# Altium footprint library PcbLib_ICs.PcbLib: 317 footprints (part 1 of 24)
Each footprint in its own frame and in the unit in brackets; x right, y up, seen from the top. Pads: shape width x height; smd on the part's side, far side on the other; paste and mask are expansions set on the pad; w line width, h text height; cw(c..) or ccw(c..) is an arc to the next point about the centre after c.
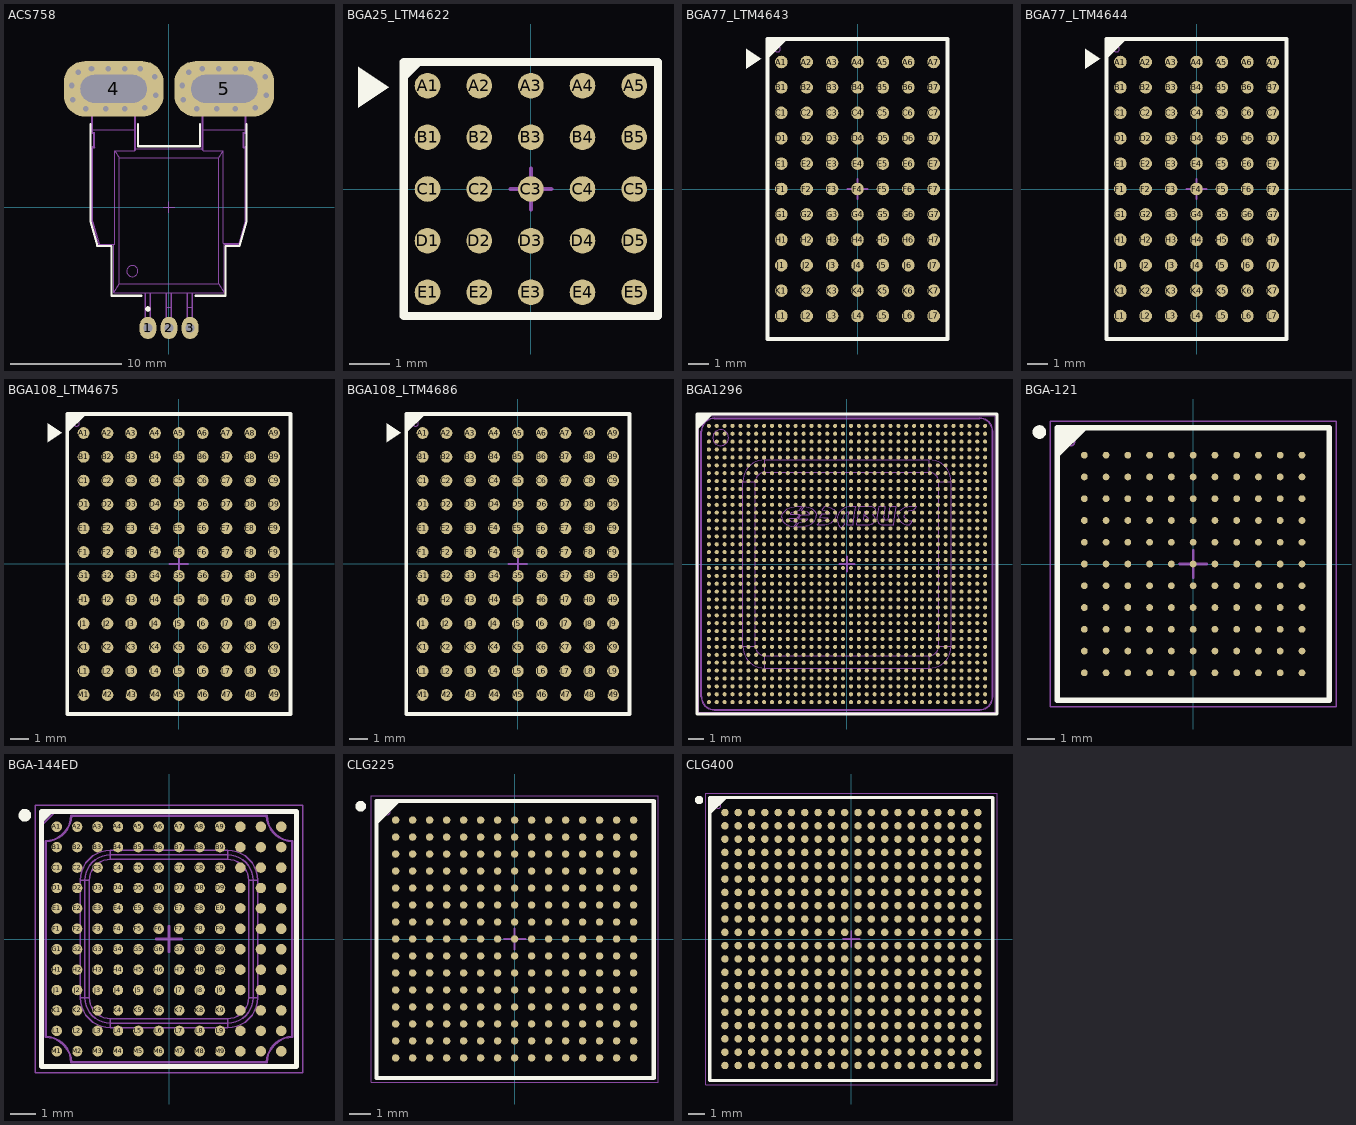
[diagram p0: the footprints below, top view; thin cyan lines are the x and y axes]

## ACS758 [mm]
pads (5):
  oval 1.5x2 hole 0.8: 1(-1.9,-10.911) 2(0,-10.911) 3(1.9,-10.911)
  rrect75% 9x5 hole 2.5 slot 6 at 0 deg mask+0.102: 4(-5,10.689) 5(5,10.689)
via 3,12.489 diameter 1.27 hole 0.5
via 4.5,12.489 diameter 1.27 hole 0.5
via 6,12.489 diameter 1.27 hole 0.5
via 7.4,12.489 diameter 1.27 hole 0.5
via 8.7,11.789 diameter 1.27 hole 0.5
via 8.8,10.089 diameter 1.27 hole 0.5
via 7.8,8.989 diameter 1.27 hole 0.5
via 6,8.889 diameter 1.27 hole 0.5
via 4.3,8.889 diameter 1.27 hole 0.5
via 2.5,8.889 diameter 1.27 hole 0.5
via 1.3,9.689 diameter 1.27 hole 0.5
via 1.8,12.189 diameter 1.27 hole 0.5
via 1.2,10.989 diameter 1.27 hole 0.5
via -8.8,10.989 diameter 1.27 hole 0.5
via -8.2,12.189 diameter 1.27 hole 0.5
via -8.7,9.689 diameter 1.27 hole 0.5
via -7.5,8.889 diameter 1.27 hole 0.5
via -5.7,8.889 diameter 1.27 hole 0.5
via -4,8.889 diameter 1.27 hole 0.5
via -2.2,8.989 diameter 1.27 hole 0.5
via -1.2,10.089 diameter 1.27 hole 0.5
via -1.3,11.789 diameter 1.27 hole 0.5
via -2.6,12.489 diameter 1.27 hole 0.5
via -4,12.489 diameter 1.27 hole 0.5
via -5.5,12.489 diameter 1.27 hole 0.5
via -7,12.489 diameter 1.27 hole 0.5
Top Overlay:
  circle w0.25: c-1.9,-9.2 r0.125
  lines w0.2: -7.1,7.504 -7.1,-1.3 -6.474,-3.492 -5.2,-3.5 -5.2,-8 -2.5,-8 ; -2.8,7.5 -2.8,5.5 2.8,5.5 2.8,7.5 ; 2.4,-8 5.1,-8 5.1,-3.5 6.374,-3.492 7,-1.3 7,7.504
Top Assy:
  drawing of 181 lines, arcs and shapes, not listed
  text ".Designator" at -5.162,-0.7 h3
Top Text:
  lines w0.1: -0.5,0 0.5,0 ; 0,-0.5 0,0.5
3D body "User Library-ACS758-1.STEP": height 7, standoff -3.5, extent -7,-11.321 7,11.321

## BGA25_LTM4622 [mm]
pads (25):
  round 0.63 smd: A1(-2.54,2.54) A2(-1.27,2.54) A3(0,2.54) A4(1.27,2.54) A5(2.54,2.54) B1(-2.54,1.27) B2(-1.27,1.27) B3(0,1.27) B4(1.27,1.27) B5(2.54,1.27) C1(-2.54,0) C2(-1.27,0) C3(0,0) C4(1.27,0) C5(2.54,0) D1(-2.54,-1.27) D2(-1.27,-1.27) D3(0,-1.27) D4(1.27,-1.27) D5(2.54,-1.27) E1(-2.54,-2.54) E2(-1.27,-2.54) E3(0,-2.54) E4(1.27,-2.54) E5(2.54,-2.54)
Top Overlay:
  region: -4.25,3 -3.5,2.5 -4.25,2
  region: -2.625,3.125 -3.125,2.625 -3.125,3.125
  lines w0.2: -3.125,-3.125 -3.125,3.125 3.125,3.125 3.125,-3.125 -3.125,-3.125
Top Assy:
  circle w0.05: c-2.625,2.625 r0.15
  lines w0.05: -3.125,-3.125 -3.125,3.125 3.125,3.125 3.125,-3.125 -3.125,-3.125
  text ".Designator" at -3.443,-0.467 h2
Top Text:
  lines w0.1: -0.5,0 0.5,0 ; 0,-0.5 0,0.5
3D body "LTM4622.STEP": height 2.42, standoff -0.05, extent -3.125,-3.125 3.125,3.125

## BGA77_LTM4643 [mm]
pads (77):
  round 0.63 smd: A1(-3.81,6.35) A2(-2.54,6.35) A3(-1.27,6.35) A4(0,6.35) A5(1.27,6.35) A6(2.54,6.35) A7(3.81,6.35) B1(-3.81,5.08) B2(-2.54,5.08) B3(-1.27,5.08) B4(0,5.08) B5(1.27,5.08) B6(2.54,5.08) B7(3.81,5.08) C1(-3.81,3.81) C2(-2.54,3.81) C3(-1.27,3.81) C4(0,3.81) C5(1.27,3.81) C6(2.54,3.81) C7(3.81,3.81) D1(-3.81,2.54) D2(-2.54,2.54) D3(-1.27,2.54) D4(0,2.54) D5(1.27,2.54) D6(2.54,2.54) D7(3.81,2.54) E1(-3.81,1.27) E2(-2.54,1.27) E3(-1.27,1.27) E4(0,1.27) E5(1.27,1.27) E6(2.54,1.27) E7(3.81,1.27) F1(-3.81,0) F2(-2.54,0) F3(-1.27,0) F4(0,0) F5(1.27,0) F6(2.54,0) F7(3.81,0) G1(-3.81,-1.27) G2(-2.54,-1.27) G3(-1.27,-1.27) G4(0,-1.27) G5(1.27,-1.27) G6(2.54,-1.27) G7(3.81,-1.27) H1(-3.81,-2.54) H2(-2.54,-2.54) H3(-1.27,-2.54) H4(0,-2.54) H5(1.27,-2.54) H6(2.54,-2.54) H7(3.81,-2.54) J1(-3.81,-3.81) J2(-2.54,-3.81) J3(-1.27,-3.81) J4(0,-3.81) J5(1.27,-3.81) J6(2.54,-3.81) J7(3.81,-3.81) K1(-3.81,-5.08) K2(-2.54,-5.08) K3(-1.27,-5.08) K4(0,-5.08) K5(1.27,-5.08) K6(2.54,-5.08) K7(3.81,-5.08) L1(-3.81,-6.35) L2(-2.54,-6.35) L3(-1.27,-6.35) L4(0,-6.35) L5(1.27,-6.35) L6(2.54,-6.35) L7(3.81,-6.35)
Top Overlay:
  region: -3.5,7.5 -4.5,6.5 -4.5,7.5
  region: -5.55,7 -4.8,6.5 -5.55,6
  lines w0.2: -4.5,-7.5 4.5,-7.5 4.5,7.5 -4.5,7.5 -4.5,-7.5
Top Assy:
  circle w0.05: c-4,7 r0.15
  lines w0.05: -4.5,-7.5 4.5,-7.5 4.5,7.5 -4.5,7.5 -4.5,-7.5
  text ".Designator" at -3.443,-0.467 h2
Top Text:
  lines w0.1: -0.5,0 0.5,0 ; 0,-0.5 0,0.5
3D body "LTM4643.STEP": height 2.42, standoff -0.05, extent -4.5,-7.5 4.5,7.5

## BGA77_LTM4644 [mm]
pads (77):
  round 0.63 smd: A1(-3.81,6.35) A2(-2.54,6.35) A3(-1.27,6.35) A4(0,6.35) A5(1.27,6.35) A6(2.54,6.35) A7(3.81,6.35) B1(-3.81,5.08) B2(-2.54,5.08) B3(-1.27,5.08) B4(0,5.08) B5(1.27,5.08) B6(2.54,5.08) B7(3.81,5.08) C1(-3.81,3.81) C2(-2.54,3.81) C3(-1.27,3.81) C4(0,3.81) C5(1.27,3.81) C6(2.54,3.81) C7(3.81,3.81) D1(-3.81,2.54) D2(-2.54,2.54) D3(-1.27,2.54) D4(0,2.54) D5(1.27,2.54) D6(2.54,2.54) D7(3.81,2.54) E1(-3.81,1.27) E2(-2.54,1.27) E3(-1.27,1.27) E4(0,1.27) E5(1.27,1.27) E6(2.54,1.27) E7(3.81,1.27) F1(-3.81,0) F2(-2.54,0) F3(-1.27,0) F4(0,0) F5(1.27,0) F6(2.54,0) F7(3.81,0) G1(-3.81,-1.27) G2(-2.54,-1.27) G3(-1.27,-1.27) G4(0,-1.27) G5(1.27,-1.27) G6(2.54,-1.27) G7(3.81,-1.27) H1(-3.81,-2.54) H2(-2.54,-2.54) H3(-1.27,-2.54) H4(0,-2.54) H5(1.27,-2.54) H6(2.54,-2.54) H7(3.81,-2.54) J1(-3.81,-3.81) J2(-2.54,-3.81) J3(-1.27,-3.81) J4(0,-3.81) J5(1.27,-3.81) J6(2.54,-3.81) J7(3.81,-3.81) K1(-3.81,-5.08) K2(-2.54,-5.08) K3(-1.27,-5.08) K4(0,-5.08) K5(1.27,-5.08) K6(2.54,-5.08) K7(3.81,-5.08) L1(-3.81,-6.35) L2(-2.54,-6.35) L3(-1.27,-6.35) L4(0,-6.35) L5(1.27,-6.35) L6(2.54,-6.35) L7(3.81,-6.35)
Top Overlay:
  region: -3.5,7.5 -4.5,6.5 -4.5,7.5
  region: -5.55,7 -4.8,6.5 -5.55,6
  lines w0.2: -4.5,-7.5 4.5,-7.5 4.5,7.5 -4.5,7.5 -4.5,-7.5
Top Assy:
  circle w0.05: c-4,7 r0.15
  lines w0.05: -4.5,-7.5 4.5,-7.5 4.5,7.5 -4.5,7.5 -4.5,-7.5
  text ".Designator" at -3.443,-0.467 h2
Top Text:
  lines w0.1: -0.5,0 0.5,0 ; 0,-0.5 0,0.5
3D body "LTM4644.STEP": height 4.91, standoff -0.05, extent -4.5,-7.5 4.5,7.5

## BGA108_LTM4675 [mm]
pads (108):
  round 0.63 smd: A1(-5.08,6.985) A2(-3.81,6.985) A3(-2.54,6.985) A4(-1.27,6.985) A5(0,6.985) A6(1.27,6.985) A7(2.54,6.985) A8(3.81,6.985) A9(5.08,6.985) B1(-5.08,5.715) B2(-3.81,5.715) B3(-2.54,5.715) B4(-1.27,5.715) B5(0,5.715) B6(1.27,5.715) B7(2.54,5.715) B8(3.81,5.715) B9(5.08,5.715) C1(-5.08,4.445) C2(-3.81,4.445) C3(-2.54,4.445) C4(-1.27,4.445) C5(0,4.445) C6(1.27,4.445) C7(2.54,4.445) C8(3.81,4.445) C9(5.08,4.445) D1(-5.08,3.175) D2(-3.81,3.175) D3(-2.54,3.175) D4(-1.27,3.175) D5(0,3.175) D6(1.27,3.175) D7(2.54,3.175) D8(3.81,3.175) D9(5.08,3.175) E1(-5.08,1.905) E2(-3.81,1.905) E3(-2.54,1.905) E4(-1.27,1.905) E5(0,1.905) E6(1.27,1.905) E7(2.54,1.905) E8(3.81,1.905) E9(5.08,1.905) F1(-5.08,0.635) F2(-3.81,0.635) F3(-2.54,0.635) F4(-1.27,0.635) F5(0,0.635) F6(1.27,0.635) F7(2.54,0.635) F8(3.81,0.635) F9(5.08,0.635) G1(-5.08,-0.635) G2(-3.81,-0.635) G3(-2.54,-0.635) G4(-1.27,-0.635) G5(0,-0.635) G6(1.27,-0.635) G7(2.54,-0.635) G8(3.81,-0.635) G9(5.08,-0.635) H1(-5.08,-1.905) H2(-3.81,-1.905) H3(-2.54,-1.905) H4(-1.27,-1.905) H5(0,-1.905) H6(1.27,-1.905) H7(2.54,-1.905) H8(3.81,-1.905) H9(5.08,-1.905) J1(-5.08,-3.175) J2(-3.81,-3.175) J3(-2.54,-3.175) J4(-1.27,-3.175) J5(0,-3.175) J6(1.27,-3.175) J7(2.54,-3.175) J8(3.81,-3.175) J9(5.08,-3.175) K1(-5.08,-4.445) K2(-3.81,-4.445) K3(-2.54,-4.445) K4(-1.27,-4.445) K5(0,-4.445) K6(1.27,-4.445) K7(2.54,-4.445) K8(3.81,-4.445) K9(5.08,-4.445) L1(-5.08,-5.715) L2(-3.81,-5.715) L3(-2.54,-5.715) L4(-1.27,-5.715) L5(0,-5.715) L6(1.27,-5.715) L7(2.54,-5.715) L8(3.81,-5.715) L9(5.08,-5.715) M1(-5.08,-6.985) M2(-3.81,-6.985) M3(-2.54,-6.985) M4(-1.27,-6.985) M5(0,-6.985) M6(1.27,-6.985) M7(2.54,-6.985) M8(3.81,-6.985) M9(5.08,-6.985)
Top Overlay:
  region: -4.95,8 -5.95,7 -5.95,8
  region: -7,7.5 -6.25,7 -7,6.5
  lines w0.2: -5.95,-8 5.95,-8 5.95,8 -5.95,8 -5.95,-8
Top Assy:
  circle w0.05: c-5.45,7.5 r0.15
  lines w0.05: -5.95,-8 5.95,-8 5.95,8 -5.95,8 -5.95,-8
  text ".Designator" at -3.443,-0.467 h2
Top Text:
  lines w0.1: -0.5,0 0.5,0 ; 0,-0.5 0,0.5
3D body "LTM4675.STEP": height 3.66, standoff -0.05, extent -5.95,-8 5.95,8

## BGA108_LTM4686 [mm]
pads (108):
  round 0.63 smd: A1(-5.08,6.985) A2(-3.81,6.985) A3(-2.54,6.985) A4(-1.27,6.985) A5(0,6.985) A6(1.27,6.985) A7(2.54,6.985) A8(3.81,6.985) A9(5.08,6.985) B1(-5.08,5.715) B2(-3.81,5.715) B3(-2.54,5.715) B4(-1.27,5.715) B5(0,5.715) B6(1.27,5.715) B7(2.54,5.715) B8(3.81,5.715) B9(5.08,5.715) C1(-5.08,4.445) C2(-3.81,4.445) C3(-2.54,4.445) C4(-1.27,4.445) C5(0,4.445) C6(1.27,4.445) C7(2.54,4.445) C8(3.81,4.445) C9(5.08,4.445) D1(-5.08,3.175) D2(-3.81,3.175) D3(-2.54,3.175) D4(-1.27,3.175) D5(0,3.175) D6(1.27,3.175) D7(2.54,3.175) D8(3.81,3.175) D9(5.08,3.175) E1(-5.08,1.905) E2(-3.81,1.905) E3(-2.54,1.905) E4(-1.27,1.905) E5(0,1.905) E6(1.27,1.905) E7(2.54,1.905) E8(3.81,1.905) E9(5.08,1.905) F1(-5.08,0.635) F2(-3.81,0.635) F3(-2.54,0.635) F4(-1.27,0.635) F5(0,0.635) F6(1.27,0.635) F7(2.54,0.635) F8(3.81,0.635) F9(5.08,0.635) G1(-5.08,-0.635) G2(-3.81,-0.635) G3(-2.54,-0.635) G4(-1.27,-0.635) G5(0,-0.635) G6(1.27,-0.635) G7(2.54,-0.635) G8(3.81,-0.635) G9(5.08,-0.635) H1(-5.08,-1.905) H2(-3.81,-1.905) H3(-2.54,-1.905) H4(-1.27,-1.905) H5(0,-1.905) H6(1.27,-1.905) H7(2.54,-1.905) H8(3.81,-1.905) H9(5.08,-1.905) J1(-5.08,-3.175) J2(-3.81,-3.175) J3(-2.54,-3.175) J4(-1.27,-3.175) J5(0,-3.175) J6(1.27,-3.175) J7(2.54,-3.175) J8(3.81,-3.175) J9(5.08,-3.175) K1(-5.08,-4.445) K2(-3.81,-4.445) K3(-2.54,-4.445) K4(-1.27,-4.445) K5(0,-4.445) K6(1.27,-4.445) K7(2.54,-4.445) K8(3.81,-4.445) K9(5.08,-4.445) L1(-5.08,-5.715) L2(-3.81,-5.715) L3(-2.54,-5.715) L4(-1.27,-5.715) L5(0,-5.715) L6(1.27,-5.715) L7(2.54,-5.715) L8(3.81,-5.715) L9(5.08,-5.715) M1(-5.08,-6.985) M2(-3.81,-6.985) M3(-2.54,-6.985) M4(-1.27,-6.985) M5(0,-6.985) M6(1.27,-6.985) M7(2.54,-6.985) M8(3.81,-6.985) M9(5.08,-6.985)
Top Overlay:
  region: -7,7.5 -6.25,7 -7,6.5
  region: -4.95,8 -5.95,7 -5.95,8
  lines w0.2: -5.95,-8 -5.95,8 5.95,8 5.95,-8 -5.95,-8
Top Assy:
  circle w0.05: c-5.45,7.5 r0.15
  lines w0.05: -5.95,-8 -5.95,8 5.95,8 5.95,-8 -5.95,-8
  text ".Designator" at -3.443,-0.467 h2
Top Text:
  lines w0.1: -0.5,0 0.5,0 ; 0,-0.5 0,0.5
3D body "LTM4686.STEP": height 2.42, standoff -0.03, extent -5.95,-8 5.95,8

## BGA1296 [mm] "36x36pin_19x19mm"
height 2.5
pads (1296):
  round 0.26 smd mask+0.06: A1(-8.75,8.75) A2(-8.25,8.75) A3(-7.75,8.75) A4(-7.25,8.75) A5(-6.75,8.75) A6(-6.25,8.75) A7(-5.75,8.75) A8(-5.25,8.75) A9(-4.75,8.75) A10(-4.25,8.75) A11(-3.75,8.75) A12(-3.25,8.75) A13(-2.75,8.75) A14(-2.25,8.75) A15(-1.75,8.75) A16(-1.25,8.75) A17(-0.75,8.75) A18(-0.25,8.75) A19(0.25,8.75) A20(0.75,8.75) A21(1.25,8.75) A22(1.75,8.75) A23(2.25,8.75) A24(2.75,8.75) A25(3.25,8.75) A26(3.75,8.75) A27(4.25,8.75) A28(4.75,8.75) A29(5.25,8.75) A30(5.75,8.75) A31(6.25,8.75) A32(6.75,8.75) A33(7.25,8.75) A34(7.75,8.75) A35(8.25,8.75) A36(8.75,8.75) AA1(-8.75,-1.25) AA2(-8.25,-1.25) AA3(-7.75,-1.25) AA4(-7.25,-1.25) AA5(-6.75,-1.25) AA6(-6.25,-1.25) AA7(-5.75,-1.25) AA8(-5.25,-1.25) AA9(-4.75,-1.25) AA10(-4.25,-1.25) AA11(-3.75,-1.25) AA12(-3.25,-1.25) AA13(-2.75,-1.25) AA14(-2.25,-1.25) AA15(-1.75,-1.25) AA16(-1.25,-1.25) AA17(-0.75,-1.25) AA18(-0.25,-1.25) AA19(0.25,-1.25) AA20(0.75,-1.25) AA21(1.25,-1.25) AA22(1.75,-1.25) AA23(2.25,-1.25) AA24(2.75,-1.25) AA25(3.25,-1.25) AA26(3.75,-1.25) AA27(4.25,-1.25) AA28(4.75,-1.25) AA29(5.25,-1.25) AA30(5.75,-1.25) AA31(6.25,-1.25) AA32(6.75,-1.25) AA33(7.25,-1.25) AA34(7.75,-1.25) AA35(8.25,-1.25) AA36(8.75,-1.25) AB1(-8.75,-1.75) AB2(-8.25,-1.75) AB3(-7.75,-1.75) AB4(-7.25,-1.75) AB5(-6.75,-1.75) AB6(-6.25,-1.75) AB7(-5.75,-1.75) AB8(-5.25,-1.75) AB9(-4.75,-1.75) AB10(-4.25,-1.75) AB11(-3.75,-1.75) AB12(-3.25,-1.75) AB13(-2.75,-1.75) AB14(-2.25,-1.75) AB15(-1.75,-1.75) AB16(-1.25,-1.75) AB17(-0.75,-1.75) AB18(-0.25,-1.75) AB19(0.25,-1.75) AB20(0.75,-1.75) AB21(1.25,-1.75) AB22(1.75,-1.75) AB23(2.25,-1.75) AB24(2.75,-1.75) AB25(3.25,-1.75) AB26(3.75,-1.75) AB27(4.25,-1.75) AB28(4.75,-1.75) AB29(5.25,-1.75) AB30(5.75,-1.75) AB31(6.25,-1.75) AB32(6.75,-1.75) AB33(7.25,-1.75) AB34(7.75,-1.75) AB35(8.25,-1.75) AB36(8.75,-1.75) AC1(-8.75,-2.25) AC2(-8.25,-2.25) AC3(-7.75,-2.25) AC4(-7.25,-2.25) AC5(-6.75,-2.25) AC6(-6.25,-2.25) AC7(-5.75,-2.25) AC8(-5.25,-2.25) AC9(-4.75,-2.25) AC10(-4.25,-2.25) AC11(-3.75,-2.25) AC12(-3.25,-2.25) AC13(-2.75,-2.25) AC14(-2.25,-2.25) AC15(-1.75,-2.25) AC16(-1.25,-2.25) AC17(-0.75,-2.25) AC18(-0.25,-2.25) AC19(0.25,-2.25) AC20(0.75,-2.25) AC21(1.25,-2.25) AC22(1.75,-2.25) AC23(2.25,-2.25) AC24(2.75,-2.25) AC25(3.25,-2.25) AC26(3.75,-2.25) AC27(4.25,-2.25) AC28(4.75,-2.25) AC29(5.25,-2.25) AC30(5.75,-2.25) AC31(6.25,-2.25) AC32(6.75,-2.25) AC33(7.25,-2.25) AC34(7.75,-2.25) AC35(8.25,-2.25) AC36(8.75,-2.25) AD1(-8.75,-2.75) AD2(-8.25,-2.75) AD3(-7.75,-2.75) AD4(-7.25,-2.75) AD5(-6.75,-2.75) AD6(-6.25,-2.75) AD7(-5.75,-2.75) AD8(-5.25,-2.75) AD9(-4.75,-2.75) AD10(-4.25,-2.75) AD11(-3.75,-2.75) AD12(-3.25,-2.75) AD13(-2.75,-2.75) AD14(-2.25,-2.75) AD15(-1.75,-2.75) AD16(-1.25,-2.75) AD17(-0.75,-2.75) AD18(-0.25,-2.75) AD19(0.25,-2.75) AD20(0.75,-2.75) AD21(1.25,-2.75) AD22(1.75,-2.75) AD23(2.25,-2.75) AD24(2.75,-2.75) AD25(3.25,-2.75) AD26(3.75,-2.75) AD27(4.25,-2.75) AD28(4.75,-2.75) AD29(5.25,-2.75) AD30(5.75,-2.75) AD31(6.25,-2.75) AD32(6.75,-2.75) AD33(7.25,-2.75) AD34(7.75,-2.75) AD35(8.25,-2.75) AD36(8.75,-2.75) AE1(-8.75,-3.25) AE2(-8.25,-3.25) AE3(-7.75,-3.25) AE4(-7.25,-3.25) AE5(-6.75,-3.25) AE6(-6.25,-3.25) AE7(-5.75,-3.25) AE8(-5.25,-3.25) AE9(-4.75,-3.25) AE10(-4.25,-3.25) AE11(-3.75,-3.25) AE12(-3.25,-3.25) AE13(-2.75,-3.25) AE14(-2.25,-3.25) AE15(-1.75,-3.25) AE16(-1.25,-3.25) AE17(-0.75,-3.25) AE18(-0.25,-3.25) AE19(0.25,-3.25) AE20(0.75,-3.25) AE21(1.25,-3.25) AE22(1.75,-3.25) AE23(2.25,-3.25) AE24(2.75,-3.25) AE25(3.25,-3.25) AE26(3.75,-3.25) AE27(4.25,-3.25) AE28(4.75,-3.25) AE29(5.25,-3.25) AE30(5.75,-3.25) AE31(6.25,-3.25) AE32(6.75,-3.25) AE33(7.25,-3.25) AE34(7.75,-3.25) AE35(8.25,-3.25) AE36(8.75,-3.25) AF1(-8.75,-3.75) AF2(-8.25,-3.75) AF3(-7.75,-3.75) AF4(-7.25,-3.75) AF5(-6.75,-3.75) AF6(-6.25,-3.75) AF7(-5.75,-3.75) AF8(-5.25,-3.75) AF9(-4.75,-3.75) AF10(-4.25,-3.75) AF11(-3.75,-3.75) AF12(-3.25,-3.75) AF13(-2.75,-3.75) AF14(-2.25,-3.75) AF15(-1.75,-3.75) AF16(-1.25,-3.75) AF17(-0.75,-3.75) AF18(-0.25,-3.75) AF19(0.25,-3.75) AF20(0.75,-3.75) AF21(1.25,-3.75) AF22(1.75,-3.75) AF23(2.25,-3.75) AF24(2.75,-3.75) AF25(3.25,-3.75) AF26(3.75,-3.75) AF27(4.25,-3.75) AF28(4.75,-3.75) AF29(5.25,-3.75) AF30(5.75,-3.75) AF31(6.25,-3.75) AF32(6.75,-3.75) AF33(7.25,-3.75) AF34(7.75,-3.75) AF35(8.25,-3.75) AF36(8.75,-3.75) AG1(-8.75,-4.25) AG2(-8.25,-4.25) AG3(-7.75,-4.25) AG4(-7.25,-4.25) AG5(-6.75,-4.25) AG6(-6.25,-4.25) AG7(-5.75,-4.25) AG8(-5.25,-4.25) AG9(-4.75,-4.25) AG10(-4.25,-4.25) AG11(-3.75,-4.25) AG12(-3.25,-4.25) AG13(-2.75,-4.25) AG14(-2.25,-4.25) AG15(-1.75,-4.25) AG16(-1.25,-4.25) AG17(-0.75,-4.25) AG18(-0.25,-4.25) AG19(0.25,-4.25) AG20(0.75,-4.25) AG21(1.25,-4.25) AG22(1.75,-4.25) AG23(2.25,-4.25) AG24(2.75,-4.25) AG25(3.25,-4.25) AG26(3.75,-4.25) AG27(4.25,-4.25) AG28(4.75,-4.25) AG29(5.25,-4.25) AG30(5.75,-4.25) AG31(6.25,-4.25) AG32(6.75,-4.25) AG33(7.25,-4.25) AG34(7.75,-4.25) AG35(8.25,-4.25) AG36(8.75,-4.25) AH1(-8.75,-4.75) AH2(-8.25,-4.75) AH3(-7.75,-4.75) AH4(-7.25,-4.75) AH5(-6.75,-4.75) AH6(-6.25,-4.75) AH7(-5.75,-4.75) AH8(-5.25,-4.75) AH9(-4.75,-4.75) AH10(-4.25,-4.75) AH11(-3.75,-4.75) AH12(-3.25,-4.75) AH13(-2.75,-4.75) AH14(-2.25,-4.75) AH15(-1.75,-4.75) AH16(-1.25,-4.75) AH17(-0.75,-4.75) AH18(-0.25,-4.75) AH19(0.25,-4.75) AH20(0.75,-4.75) AH21(1.25,-4.75) AH22(1.75,-4.75) AH23(2.25,-4.75) AH24(2.75,-4.75) AH25(3.25,-4.75) AH26(3.75,-4.75) AH27(4.25,-4.75) AH28(4.75,-4.75) AH29(5.25,-4.75) AH30(5.75,-4.75) AH31(6.25,-4.75) AH32(6.75,-4.75) AH33(7.25,-4.75) AH34(7.75,-4.75) AH35(8.25,-4.75) AH36(8.75,-4.75) AJ1(-8.75,-5.25) AJ2(-8.25,-5.25) AJ3(-7.75,-5.25) AJ4(-7.25,-5.25) AJ5(-6.75,-5.25) AJ6(-6.25,-5.25) AJ7(-5.75,-5.25) AJ8(-5.25,-5.25) AJ9(-4.75,-5.25) AJ10(-4.25,-5.25) AJ11(-3.75,-5.25) AJ12(-3.25,-5.25) AJ13(-2.75,-5.25) AJ14(-2.25,-5.25) AJ15(-1.75,-5.25) AJ16(-1.25,-5.25) AJ17(-0.75,-5.25) AJ18(-0.25,-5.25) AJ19(0.25,-5.25) AJ20(0.75,-5.25) AJ21(1.25,-5.25) AJ22(1.75,-5.25) AJ23(2.25,-5.25) AJ24(2.75,-5.25) AJ25(3.25,-5.25) AJ26(3.75,-5.25) AJ27(4.25,-5.25) AJ28(4.75,-5.25) AJ29(5.25,-5.25) AJ30(5.75,-5.25) AJ31(6.25,-5.25) AJ32(6.75,-5.25) AJ33(7.25,-5.25) AJ34(7.75,-5.25) AJ35(8.25,-5.25) AJ36(8.75,-5.25) AK1(-8.75,-5.75) AK2(-8.25,-5.75) AK3(-7.75,-5.75) AK4(-7.25,-5.75) AK5(-6.75,-5.75) AK6(-6.25,-5.75) AK7(-5.75,-5.75) AK8(-5.25,-5.75) AK9(-4.75,-5.75) AK10(-4.25,-5.75) AK11(-3.75,-5.75) AK12(-3.25,-5.75) AK13(-2.75,-5.75) AK14(-2.25,-5.75) AK15(-1.75,-5.75) AK16(-1.25,-5.75) AK17(-0.75,-5.75) AK18(-0.25,-5.75) AK19(0.25,-5.75) AK20(0.75,-5.75) AK21(1.25,-5.75) AK22(1.75,-5.75) AK23(2.25,-5.75) AK24(2.75,-5.75) AK25(3.25,-5.75) AK26(3.75,-5.75) AK27(4.25,-5.75) AK28(4.75,-5.75) AK29(5.25,-5.75) AK30(5.75,-5.75) AK31(6.25,-5.75) AK32(6.75,-5.75) AK33(7.25,-5.75) AK34(7.75,-5.75) AK35(8.25,-5.75) AK36(8.75,-5.75) AL1(-8.75,-6.25) AL2(-8.25,-6.25) AL3(-7.75,-6.25) AL4(-7.25,-6.25) AL5(-6.75,-6.25) AL6(-6.25,-6.25) AL7(-5.75,-6.25) AL8(-5.25,-6.25) AL9(-4.75,-6.25) AL10(-4.25,-6.25) AL11(-3.75,-6.25) AL12(-3.25,-6.25) AL13(-2.75,-6.25) AL14(-2.25,-6.25) AL15(-1.75,-6.25) AL16(-1.25,-6.25) AL17(-0.75,-6.25) AL18(-0.25,-6.25) AL19(0.25,-6.25) AL20(0.75,-6.25) AL21(1.25,-6.25) AL22(1.75,-6.25) AL23(2.25,-6.25) AL24(2.75,-6.25) AL25(3.25,-6.25) AL26(3.75,-6.25) AL27(4.25,-6.25) AL28(4.75,-6.25) AL29(5.25,-6.25) AL30(5.75,-6.25) AL31(6.25,-6.25) AL32(6.75,-6.25) AL33(7.25,-6.25) AL34(7.75,-6.25) AL35(8.25,-6.25) AL36(8.75,-6.25) AM1(-8.75,-6.75) AM2(-8.25,-6.75) AM3(-7.75,-6.75) AM4(-7.25,-6.75) AM5(-6.75,-6.75) AM6(-6.25,-6.75) AM7(-5.75,-6.75) AM8(-5.25,-6.75) AM9(-4.75,-6.75) AM10(-4.25,-6.75) AM11(-3.75,-6.75) AM12(-3.25,-6.75) AM13(-2.75,-6.75) AM14(-2.25,-6.75) AM15(-1.75,-6.75) AM16(-1.25,-6.75) AM17(-0.75,-6.75) AM18(-0.25,-6.75) AM19(0.25,-6.75) AM20(0.75,-6.75) AM21(1.25,-6.75) AM22(1.75,-6.75) AM23(2.25,-6.75) AM24(2.75,-6.75) AM25(3.25,-6.75) AM26(3.75,-6.75) AM27(4.25,-6.75) AM28(4.75,-6.75) AM29(5.25,-6.75) AM30(5.75,-6.75) AM31(6.25,-6.75) AM32(6.75,-6.75) AM33(7.25,-6.75) AM34(7.75,-6.75) AM35(8.25,-6.75) AM36(8.75,-6.75) AN1(-8.75,-7.25) AN2(-8.25,-7.25) AN3(-7.75,-7.25) AN4(-7.25,-7.25) AN5(-6.75,-7.25) AN6(-6.25,-7.25) AN7(-5.75,-7.25) AN8(-5.25,-7.25) AN9(-4.75,-7.25) AN10(-4.25,-7.25) AN11(-3.75,-7.25) AN12(-3.25,-7.25) AN13(-2.75,-7.25) AN14(-2.25,-7.25) AN15(-1.75,-7.25) AN16(-1.25,-7.25) AN17(-0.75,-7.25) AN18(-0.25,-7.25) AN19(0.25,-7.25) AN20(0.75,-7.25) AN21(1.25,-7.25) AN22(1.75,-7.25) AN23(2.25,-7.25) AN24(2.75,-7.25) AN25(3.25,-7.25) AN26(3.75,-7.25) AN27(4.25,-7.25) AN28(4.75,-7.25) AN29(5.25,-7.25) AN30(5.75,-7.25) AN31(6.25,-7.25) AN32(6.75,-7.25) AN33(7.25,-7.25) AN34(7.75,-7.25) AN35(8.25,-7.25) AN36(8.75,-7.25) AP1(-8.75,-7.75) AP2(-8.25,-7.75) AP3(-7.75,-7.75) AP4(-7.25,-7.75) AP5(-6.75,-7.75) AP6(-6.25,-7.75) AP7(-5.75,-7.75) AP8(-5.25,-7.75) AP9(-4.75,-7.75) AP10(-4.25,-7.75) AP11(-3.75,-7.75) AP12(-3.25,-7.75) AP13(-2.75,-7.75) AP14(-2.25,-7.75) AP15(-1.75,-7.75) AP16(-1.25,-7.75) AP17(-0.75,-7.75) AP18(-0.25,-7.75) AP19(0.25,-7.75) AP20(0.75,-7.75) AP21(1.25,-7.75) AP22(1.75,-7.75) AP23(2.25,-7.75) AP24(2.75,-7.75) AP25(3.25,-7.75) AP26(3.75,-7.75) AP27(4.25,-7.75) AP28(4.75,-7.75) AP29(5.25,-7.75) AP30(5.75,-7.75) AP31(6.25,-7.75) AP32(6.75,-7.75) AP33(7.25,-7.75) AP34(7.75,-7.75) AP35(8.25,-7.75) AP36(8.75,-7.75) AR1(-8.75,-8.25) AR2(-8.25,-8.25) AR3(-7.75,-8.25) AR4(-7.25,-8.25) AR5(-6.75,-8.25) AR6(-6.25,-8.25) AR7(-5.75,-8.25) AR8(-5.25,-8.25) AR9(-4.75,-8.25) AR10(-4.25,-8.25) AR11(-3.75,-8.25) AR12(-3.25,-8.25) AR13(-2.75,-8.25) AR14(-2.25,-8.25) AR15(-1.75,-8.25) AR16(-1.25,-8.25) AR17(-0.75,-8.25) AR18(-0.25,-8.25) AR19(0.25,-8.25) AR20(0.75,-8.25) AR21(1.25,-8.25) AR22(1.75,-8.25) AR23(2.25,-8.25) AR24(2.75,-8.25) AR25(3.25,-8.25) AR26(3.75,-8.25) AR27(4.25,-8.25) AR28(4.75,-8.25) AR29(5.25,-8.25) AR30(5.75,-8.25) AR31(6.25,-8.25) AR32(6.75,-8.25) AR33(7.25,-8.25) AR34(7.75,-8.25) AR35(8.25,-8.25) AR36(8.75,-8.25) AT1(-8.75,-8.75) AT2(-8.25,-8.75) AT3(-7.75,-8.75) AT4(-7.25,-8.75) AT5(-6.75,-8.75) AT6(-6.25,-8.75) AT7(-5.75,-8.75) AT8(-5.25,-8.75) AT9(-4.75,-8.75) AT10(-4.25,-8.75) AT11(-3.75,-8.75) AT12(-3.25,-8.75) AT13(-2.75,-8.75) AT14(-2.25,-8.75) AT15(-1.75,-8.75) AT16(-1.25,-8.75) AT17(-0.75,-8.75) AT18(-0.25,-8.75) AT19(0.25,-8.75) AT20(0.75,-8.75) AT21(1.25,-8.75) AT22(1.75,-8.75) AT23(2.25,-8.75) AT24(2.75,-8.75) AT25(3.25,-8.75) AT26(3.75,-8.75) AT27(4.25,-8.75) AT28(4.75,-8.75) AT29(5.25,-8.75) AT30(5.75,-8.75) AT31(6.25,-8.75) AT32(6.75,-8.75) AT33(7.25,-8.75) AT34(7.75,-8.75) AT35(8.25,-8.75) AT36(8.75,-8.75) B1(-8.75,8.25) B2(-8.25,8.25) B3(-7.75,8.25) B4(-7.25,8.25) B5(-6.75,8.25) B6(-6.25,8.25) B7(-5.75,8.25) B8(-5.25,8.25) B9(-4.75,8.25) B10(-4.25,8.25) B11(-3.75,8.25) B12(-3.25,8.25) B13(-2.75,8.25) B14(-2.25,8.25) B15(-1.75,8.25) B16(-1.25,8.25) B17(-0.75,8.25) B18(-0.25,8.25) B19(0.25,8.25) B20(0.75,8.25) B21(1.25,8.25) B22(1.75,8.25) B23(2.25,8.25) B24(2.75,8.25) B25(3.25,8.25) B26(3.75,8.25) B27(4.25,8.25) B28(4.75,8.25) B29(5.25,8.25) B30(5.75,8.25) B31(6.25,8.25) B32(6.75,8.25) B33(7.25,8.25) B34(7.75,8.25) B35(8.25,8.25) B36(8.75,8.25) C1(-8.75,7.75) C2(-8.25,7.75) C3(-7.75,7.75) C4(-7.25,7.75) C5(-6.75,7.75) C6(-6.25,7.75) C7(-5.75,7.75) C8(-5.25,7.75) C9(-4.75,7.75) C10(-4.25,7.75) C11(-3.75,7.75) C12(-3.25,7.75) C13(-2.75,7.75) C14(-2.25,7.75) C15(-1.75,7.75) C16(-1.25,7.75) C17(-0.75,7.75) C18(-0.25,7.75) C19(0.25,7.75) C20(0.75,7.75) C21(1.25,7.75) C22(1.75,7.75) C23(2.25,7.75) C24(2.75,7.75) C25(3.25,7.75) C26(3.75,7.75) C27(4.25,7.75) C28(4.75,7.75) C29(5.25,7.75) C30(5.75,7.75) C31(6.25,7.75) C32(6.75,7.75) C33(7.25,7.75) C34(7.75,7.75) C35(8.25,7.75) C36(8.75,7.75) D1(-8.75,7.25) D2(-8.25,7.25) D3(-7.75,7.25) D4(-7.25,7.25) D5(-6.75,7.25) D6(-6.25,7.25) D7(-5.75,7.25) D8(-5.25,7.25) D9(-4.75,7.25) D10(-4.25,7.25) D11(-3.75,7.25) D12(-3.25,7.25) D13(-2.75,7.25) D14(-2.25,7.25) D15(-1.75,7.25) D16(-1.25,7.25) D17(-0.75,7.25) D18(-0.25,7.25) D19(0.25,7.25) D20(0.75,7.25) D21(1.25,7.25) D22(1.75,7.25) D23(2.25,7.25) D24(2.75,7.25) D25(3.25,7.25) D26(3.75,7.25) D27(4.25,7.25) D28(4.75,7.25) D29(5.25,7.25) D30(5.75,7.25) D31(6.25,7.25) D32(6.75,7.25) D33(7.25,7.25) D34(7.75,7.25) D35(8.25,7.25) D36(8.75,7.25) E1(-8.75,6.75) E2(-8.25,6.75) E3(-7.75,6.75) E4(-7.25,6.75) E5(-6.75,6.75) E6(-6.25,6.75) E7(-5.75,6.75) E8(-5.25,6.75) E9(-4.75,6.75) E10(-4.25,6.75) E11(-3.75,6.75) E12(-3.25,6.75) E13(-2.75,6.75) E14(-2.25,6.75) E15(-1.75,6.75) E16(-1.25,6.75) E17(-0.75,6.75) E18(-0.25,6.75) E19(0.25,6.75) E20(0.75,6.75) E21(1.25,6.75) E22(1.75,6.75) E23(2.25,6.75) E24(2.75,6.75) E25(3.25,6.75) E26(3.75,6.75) E27(4.25,6.75) E28(4.75,6.75) E29(5.25,6.75) E30(5.75,6.75) E31(6.25,6.75) E32(6.75,6.75) E33(7.25,6.75) E34(7.75,6.75) E35(8.25,6.75) E36(8.75,6.75) F1(-8.75,6.25) F2(-8.25,6.25) F3(-7.75,6.25) F4(-7.25,6.25) F5(-6.75,6.25) F6(-6.25,6.25) F7(-5.75,6.25) F8(-5.25,6.25) F9(-4.75,6.25) F10(-4.25,6.25) F11(-3.75,6.25) F12(-3.25,6.25) F13(-2.75,6.25) F14(-2.25,6.25) F15(-1.75,6.25) F16(-1.25,6.25) F17(-0.75,6.25) F18(-0.25,6.25) F19(0.25,6.25) F20(0.75,6.25) F21(1.25,6.25) F22(1.75,6.25) F23(2.25,6.25) F24(2.75,6.25) F25(3.25,6.25) F26(3.75,6.25) F27(4.25,6.25) F28(4.75,6.25) F29(5.25,6.25) F30(5.75,6.25) F31(6.25,6.25) F32(6.75,6.25) F33(7.25,6.25) F34(7.75,6.25) F35(8.25,6.25) F36(8.75,6.25) G1(-8.75,5.75) G2(-8.25,5.75) G3(-7.75,5.75) G4(-7.25,5.75) G5(-6.75,5.75) G6(-6.25,5.75) G7(-5.75,5.75) G8(-5.25,5.75) G9(-4.75,5.75) G10(-4.25,5.75) G11(-3.75,5.75) G12(-3.25,5.75) G13(-2.75,5.75) G14(-2.25,5.75) G15(-1.75,5.75) G16(-1.25,5.75) G17(-0.75,5.75) G18(-0.25,5.75) G19(0.25,5.75) G20(0.75,5.75) G21(1.25,5.75) G22(1.75,5.75) G23(2.25,5.75) G24(2.75,5.75) G25(3.25,5.75) G26(3.75,5.75) G27(4.25,5.75) G28(4.75,5.75) G29(5.25,5.75) G30(5.75,5.75) G31(6.25,5.75) G32(6.75,5.75) G33(7.25,5.75) G34(7.75,5.75) G35(8.25,5.75) G36(8.75,5.75) H1(-8.75,5.25) H2(-8.25,5.25) H3(-7.75,5.25) H4(-7.25,5.25) H5(-6.75,5.25) H6(-6.25,5.25) H7(-5.75,5.25) H8(-5.25,5.25) H9(-4.75,5.25) H10(-4.25,5.25) H11(-3.75,5.25) H12(-3.25,5.25) H13(-2.75,5.25) H14(-2.25,5.25) H15(-1.75,5.25) H16(-1.25,5.25) H17(-0.75,5.25) H18(-0.25,5.25) H19(0.25,5.25) H20(0.75,5.25) H21(1.25,5.25) H22(1.75,5.25) H23(2.25,5.25) H24(2.75,5.25) H25(3.25,5.25) H26(3.75,5.25) H27(4.25,5.25) H28(4.75,5.25) H29(5.25,5.25) H30(5.75,5.25) H31(6.25,5.25) H32(6.75,5.25) H33(7.25,5.25) H34(7.75,5.25) H35(8.25,5.25) H36(8.75,5.25) J1(-8.75,4.75) J2(-8.25,4.75) J3(-7.75,4.75) J4(-7.25,4.75) J5(-6.75,4.75) J6(-6.25,4.75) J7(-5.75,4.75) J8(-5.25,4.75) J9(-4.75,4.75) J10(-4.25,4.75) J11(-3.75,4.75) J12(-3.25,4.75) J13(-2.75,4.75) J14(-2.25,4.75) J15(-1.75,4.75) J16(-1.25,4.75) J17(-0.75,4.75) J18(-0.25,4.75) J19(0.25,4.75) J20(0.75,4.75) J21(1.25,4.75) J22(1.75,4.75) J23(2.25,4.75) J24(2.75,4.75) J25(3.25,4.75) J26(3.75,4.75) J27(4.25,4.75) J28(4.75,4.75) J29(5.25,4.75) J30(5.75,4.75) J31(6.25,4.75) J32(6.75,4.75) J33(7.25,4.75) J34(7.75,4.75) J35(8.25,4.75) J36(8.75,4.75) K1(-8.75,4.25) K2(-8.25,4.25) K3(-7.75,4.25) K4(-7.25,4.25) K5(-6.75,4.25) K6(-6.25,4.25) K7(-5.75,4.25) K8(-5.25,4.25) K9(-4.75,4.25) K10(-4.25,4.25) K11(-3.75,4.25) K12(-3.25,4.25) K13(-2.75,4.25) K14(-2.25,4.25) K15(-1.75,4.25) K16(-1.25,4.25) K17(-0.75,4.25) K18(-0.25,4.25) K19(0.25,4.25) K20(0.75,4.25) K21(1.25,4.25) K22(1.75,4.25) K23(2.25,4.25) K24(2.75,4.25) K25(3.25,4.25) K26(3.75,4.25) K27(4.25,4.25) K28(4.75,4.25) K29(5.25,4.25) K30(5.75,4.25) K31(6.25,4.25) K32(6.75,4.25) K33(7.25,4.25) K34(7.75,4.25) K35(8.25,4.25) K36(8.75,4.25) L1(-8.75,3.75) L2(-8.25,3.75) L3(-7.75,3.75) L4(-7.25,3.75) L5(-6.75,3.75) L6(-6.25,3.75) L7(-5.75,3.75) L8(-5.25,3.75) L9(-4.75,3.75) L10(-4.25,3.75) L11(-3.75,3.75) L12(-3.25,3.75) L13(-2.75,3.75) L14(-2.25,3.75) L15(-1.75,3.75) L16(-1.25,3.75) L17(-0.75,3.75) L18(-0.25,3.75) L19(0.25,3.75) L20(0.75,3.75) L21(1.25,3.75) L22(1.75,3.75) L23(2.25,3.75) L24(2.75,3.75) L25(3.25,3.75) L26(3.75,3.75) L27(4.25,3.75) L28(4.75,3.75) L29(5.25,3.75) L30(5.75,3.75) L31(6.25,3.75) L32(6.75,3.75) L33(7.25,3.75) L34(7.75,3.75) L35(8.25,3.75) L36(8.75,3.75) M1(-8.75,3.25) M2(-8.25,3.25) M3(-7.75,3.25) M4(-7.25,3.25) M5(-6.75,3.25) M6(-6.25,3.25) M7(-5.75,3.25) M8(-5.25,3.25) M9(-4.75,3.25) M10(-4.25,3.25) M11(-3.75,3.25) M12(-3.25,3.25) M13(-2.75,3.25) M14(-2.25,3.25) M15(-1.75,3.25) M16(-1.25,3.25) M17(-0.75,3.25) M18(-0.25,3.25) M19(0.25,3.25) M20(0.75,3.25) M21(1.25,3.25) M22(1.75,3.25) M23(2.25,3.25) M24(2.75,3.25) M25(3.25,3.25) M26(3.75,3.25) M27(4.25,3.25) M28(4.75,3.25) M29(5.25,3.25) M30(5.75,3.25) M31(6.25,3.25) M32(6.75,3.25) M33(7.25,3.25) M34(7.75,3.25) M35(8.25,3.25) M36(8.75,3.25) N1(-8.75,2.75) N2(-8.25,2.75) N3(-7.75,2.75) N4(-7.25,2.75) N5(-6.75,2.75) N6(-6.25,2.75) N7(-5.75,2.75) N8(-5.25,2.75) N9(-4.75,2.75) N10(-4.25,2.75) N11(-3.75,2.75) N12(-3.25,2.75) N13(-2.75,2.75) N14(-2.25,2.75) N15(-1.75,2.75) N16(-1.25,2.75) N17(-0.75,2.75) N18(-0.25,2.75) N19(0.25,2.75) N20(0.75,2.75) N21(1.25,2.75) N22(1.75,2.75) N23(2.25,2.75) N24(2.75,2.75) N25(3.25,2.75) N26(3.75,2.75) N27(4.25,2.75) N28(4.75,2.75) N29(5.25,2.75) N30(5.75,2.75) N31(6.25,2.75) N32(6.75,2.75) N33(7.25,2.75) N34(7.75,2.75) N35(8.25,2.75) N36(8.75,2.75) P1(-8.75,2.25) P2(-8.25,2.25) P3(-7.75,2.25) P4(-7.25,2.25) P5(-6.75,2.25) P6(-6.25,2.25) P7(-5.75,2.25) P8(-5.25,2.25) P9(-4.75,2.25) P10(-4.25,2.25) P11(-3.75,2.25) P12(-3.25,2.25) P13(-2.75,2.25) P14(-2.25,2.25) P15(-1.75,2.25) P16(-1.25,2.25) P17(-0.75,2.25) P18(-0.25,2.25) P19(0.25,2.25) P20(0.75,2.25) P21(1.25,2.25) P22(1.75,2.25) P23(2.25,2.25) P24(2.75,2.25) P25(3.25,2.25) P26(3.75,2.25) P27(4.25,2.25) P28(4.75,2.25) P29(5.25,2.25) P30(5.75,2.25) P31(6.25,2.25) P32(6.75,2.25) P33(7.25,2.25) P34(7.75,2.25) P35(8.25,2.25) P36(8.75,2.25) R1(-8.75,1.75) R2(-8.25,1.75) R3(-7.75,1.75) R4(-7.25,1.75) R5(-6.75,1.75) R6(-6.25,1.75) R7(-5.75,1.75) R8(-5.25,1.75) R9(-4.75,1.75) R10(-4.25,1.75) R11(-3.75,1.75) R12(-3.25,1.75) R13(-2.75,1.75) R14(-2.25,1.75) R15(-1.75,1.75) R16(-1.25,1.75) R17(-0.75,1.75) R18(-0.25,1.75) R19(0.25,1.75) R20(0.75,1.75) R21(1.25,1.75) R22(1.75,1.75) R23(2.25,1.75) R24(2.75,1.75) R25(3.25,1.75) R26(3.75,1.75) R27(4.25,1.75) R28(4.75,1.75) R29(5.25,1.75) R30(5.75,1.75) R31(6.25,1.75) R32(6.75,1.75) R33(7.25,1.75) R34(7.75,1.75) R35(8.25,1.75) R36(8.75,1.75) T1(-8.75,1.25) T2(-8.25,1.25) T3(-7.75,1.25) T4(-7.25,1.25) T5(-6.75,1.25) T6(-6.25,1.25) T7(-5.75,1.25) T8(-5.25,1.25) T9(-4.75,1.25) T10(-4.25,1.25) T11(-3.75,1.25) T12(-3.25,1.25) T13(-2.75,1.25) T14(-2.25,1.25) T15(-1.75,1.25) T16(-1.25,1.25) T17(-0.75,1.25) T18(-0.25,1.25) T19(0.25,1.25) T20(0.75,1.25) T21(1.25,1.25) T22(1.75,1.25) T23(2.25,1.25) T24(2.75,1.25) T25(3.25,1.25) T26(3.75,1.25) T27(4.25,1.25) T28(4.75,1.25) T29(5.25,1.25) T30(5.75,1.25) T31(6.25,1.25) T32(6.75,1.25) T33(7.25,1.25) T34(7.75,1.25) T35(8.25,1.25) T36(8.75,1.25) U1(-8.75,0.75) U2(-8.25,0.75) U3(-7.75,0.75) U4(-7.25,0.75) U5(-6.75,0.75) U6(-6.25,0.75) U7(-5.75,0.75) U8(-5.25,0.75) U9(-4.75,0.75) U10(-4.25,0.75) U11(-3.75,0.75) U12(-3.25,0.75) U13(-2.75,0.75) U14(-2.25,0.75) U15(-1.75,0.75) U16(-1.25,0.75) U17(-0.75,0.75) U18(-0.25,0.75) U19(0.25,0.75) U20(0.75,0.75) U21(1.25,0.75) U22(1.75,0.75) U23(2.25,0.75) U24(2.75,0.75) U25(3.25,0.75) U26(3.75,0.75) U27(4.25,0.75) U28(4.75,0.75) U29(5.25,0.75) U30(5.75,0.75) U31(6.25,0.75) U32(6.75,0.75) U33(7.25,0.75) U34(7.75,0.75) U35(8.25,0.75) U36(8.75,0.75) V1(-8.75,0.25) V2(-8.25,0.25) V3(-7.75,0.25) V4(-7.25,0.25) V5(-6.75,0.25) V6(-6.25,0.25) V7(-5.75,0.25) V8(-5.25,0.25) V9(-4.75,0.25) V10(-4.25,0.25) V11(-3.75,0.25) V12(-3.25,0.25) V13(-2.75,0.25) V14(-2.25,0.25) V15(-1.75,0.25) V16(-1.25,0.25) V17(-0.75,0.25) V18(-0.25,0.25) V19(0.25,0.25) V20(0.75,0.25) V21(1.25,0.25) V22(1.75,0.25) V23(2.25,0.25) V24(2.75,0.25) V25(3.25,0.25) V26(3.75,0.25) V27(4.25,0.25) V28(4.75,0.25) V29(5.25,0.25) V30(5.75,0.25) V31(6.25,0.25) V32(6.75,0.25) V33(7.25,0.25) V34(7.75,0.25) V35(8.25,0.25) V36(8.75,0.25) W1(-8.75,-0.25) W2(-8.25,-0.25) W3(-7.75,-0.25) W4(-7.25,-0.25) W5(-6.75,-0.25) W6(-6.25,-0.25) W7(-5.75,-0.25) W8(-5.25,-0.25) W9(-4.75,-0.25) W10(-4.25,-0.25) 